# Altium schematic symbol library MYLIB.SchLib: 366 symbols (part 2 of 52)
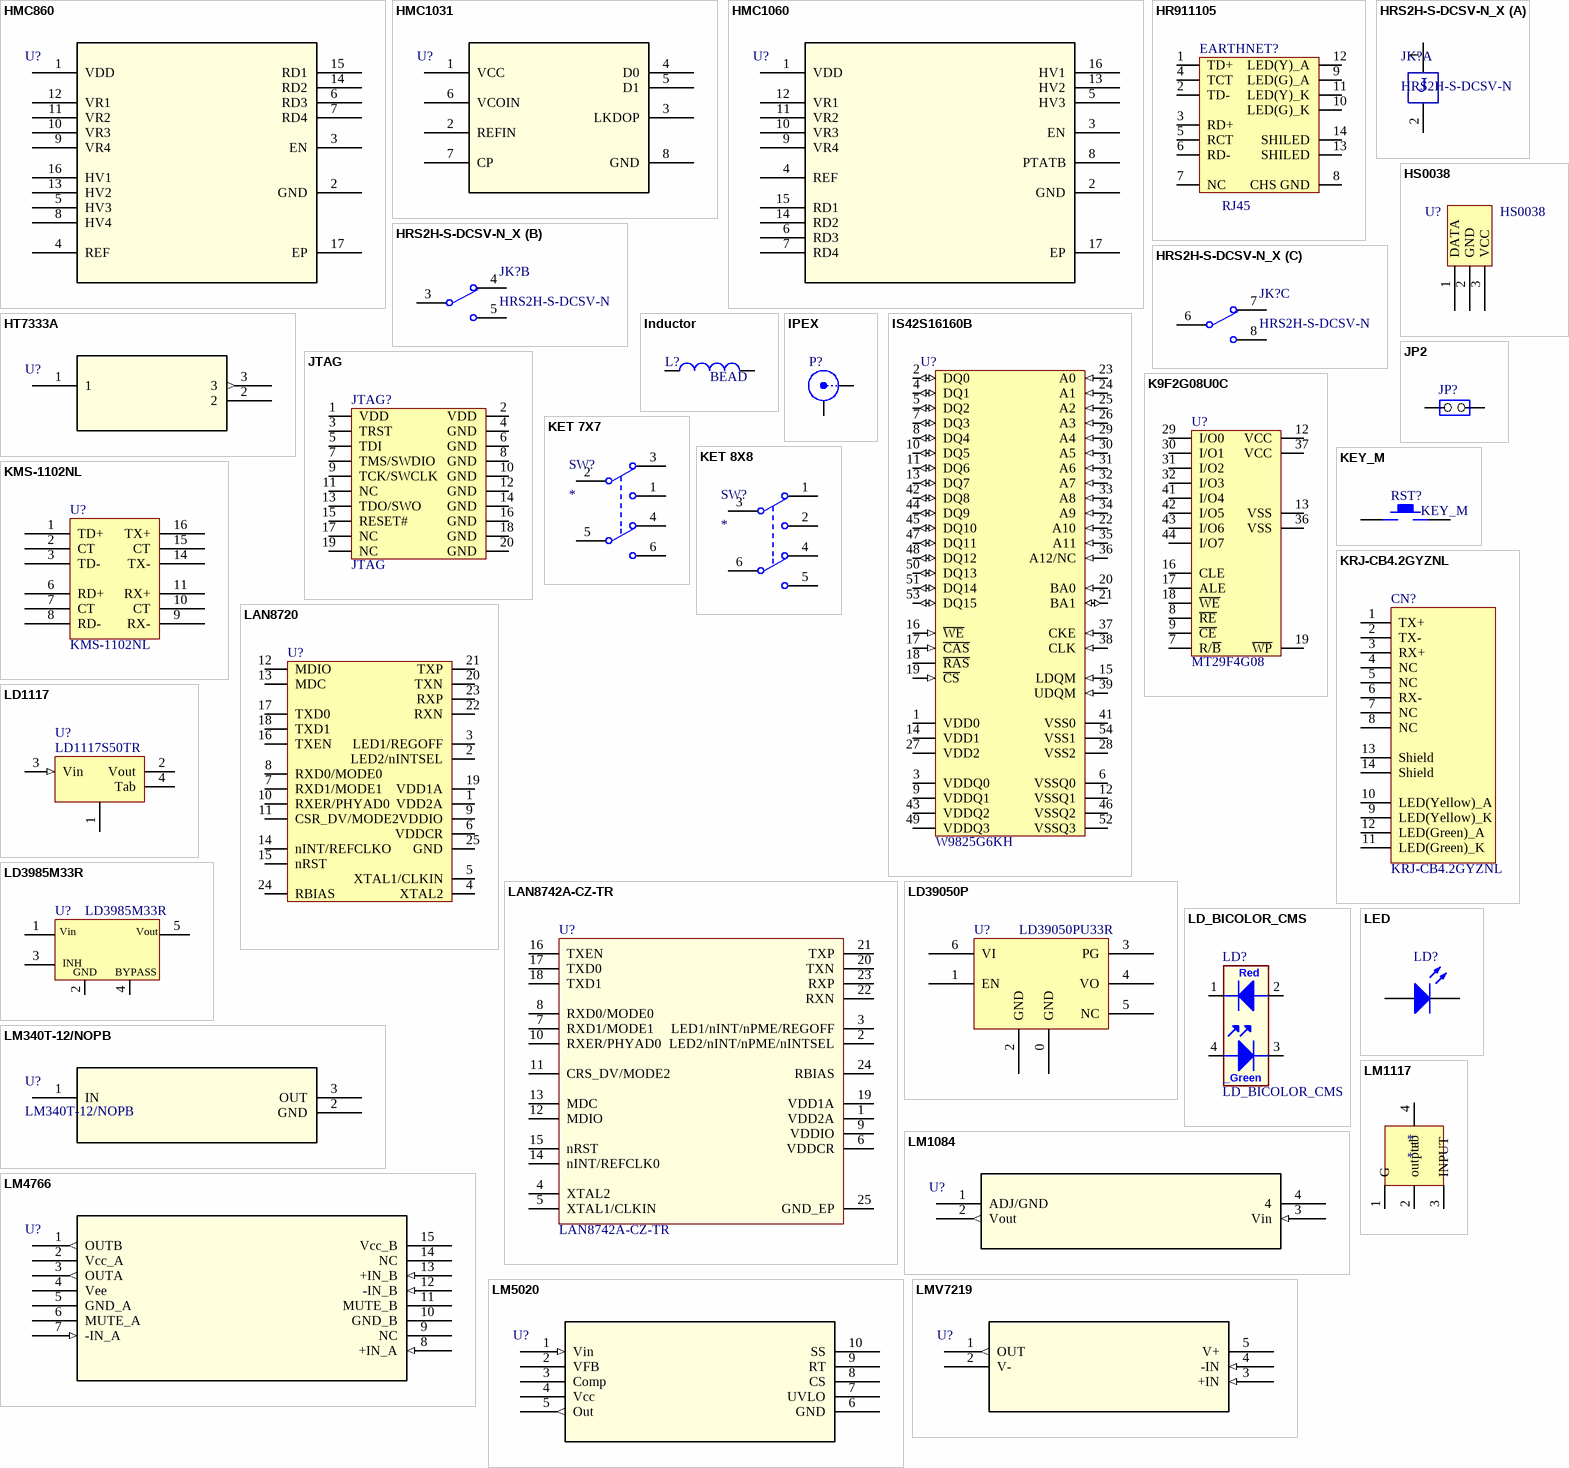
[diagram p308: symbols HMC860 to LMV7219]

## LM1084
designator U?
5A 固定/可调输出线性稳压器; Manufacturer_Part_Number: LM1084ISX-3.3/NOPB; Vendor: Texas Instruments; Built_By: EMA_UL_Team; Copyright: Copyright (C) 2018 Accelerated Designs. All rights reserved; RefDes: RefDes; Type: DEV; Value: Value
footprint TS3B
footprint TS3B-L
footprint TS3B-M
pins: 1 ADJ/GND, 2 Vout (out), 3 Vin (in), 4

## LM1117
designator *
footprint lm 1117 (SOT223, 4-Leads, Body 6.50x7.00mm (avg), Pitch 2.30mm, IPC Medium Density)
pins: 1 G, 2 output, 3 INPUT, 4 tab

## LM4766
designator U?
Manufacturer_Part_Number: LM4766T/NOPB; Vendor: Texas Instruments; Built_By: EMA_UL_Team; Copyright: Copyright (C) 2018 Accelerated Designs. All rights reserved; RefDes: RefDes; Type: DEV; Value: Value
footprint TA15A
pins: 1 OUTB (out), 2 Vcc_A, 3 OUTA (out), 4 Vee, 5 GND_A, 6 MUTE_A, 7 -IN_A (in), 8 +IN_A (in), 9 NC, 10 GND_B, 11 MUTE_B, 12 -IN_B (in), 13 +IN_B (in), 14 NC, 15 Vcc_B

## LM5020
designator U?
13-100V 宽输入电压、电流模式 PWM 升压控制器; Manufacturer_Part_Number: LM5020MM-2/NOPB; Vendor: Texas Instruments; Built_By: EMA_UL_Team; Copyright: Copyright (C) 2018 Accelerated Designs. All rights reserved; RefDes: RefDes; Type: DEV; Value: Value
footprint MUB10A
pins: 1 Vin (in), 2 VFB, 3 Comp, 4 Vcc, 5 Out (out), 6 GND, 7 UVLO, 8 CS, 9 RT, 10 SS

## LMV7219
designator U?
LMV7219 7-ns 2.7-V to 5-V Comparator with Rail-to-Rail Output; Manufacturer_Part_Number: LMV7219M7/NOPB; Vendor: Texas Instruments; Built_By: EMA_UL_Team; Copyright: Copyright (C) 2018 Accelerated Designs. All rights reserved; RefDes: RefDes; Type: DEV; Value: Value
footprint MAA05A
pins: 1 OUT (out), 2 V-, 3 +IN (in), 4 -IN (in), 5 V+

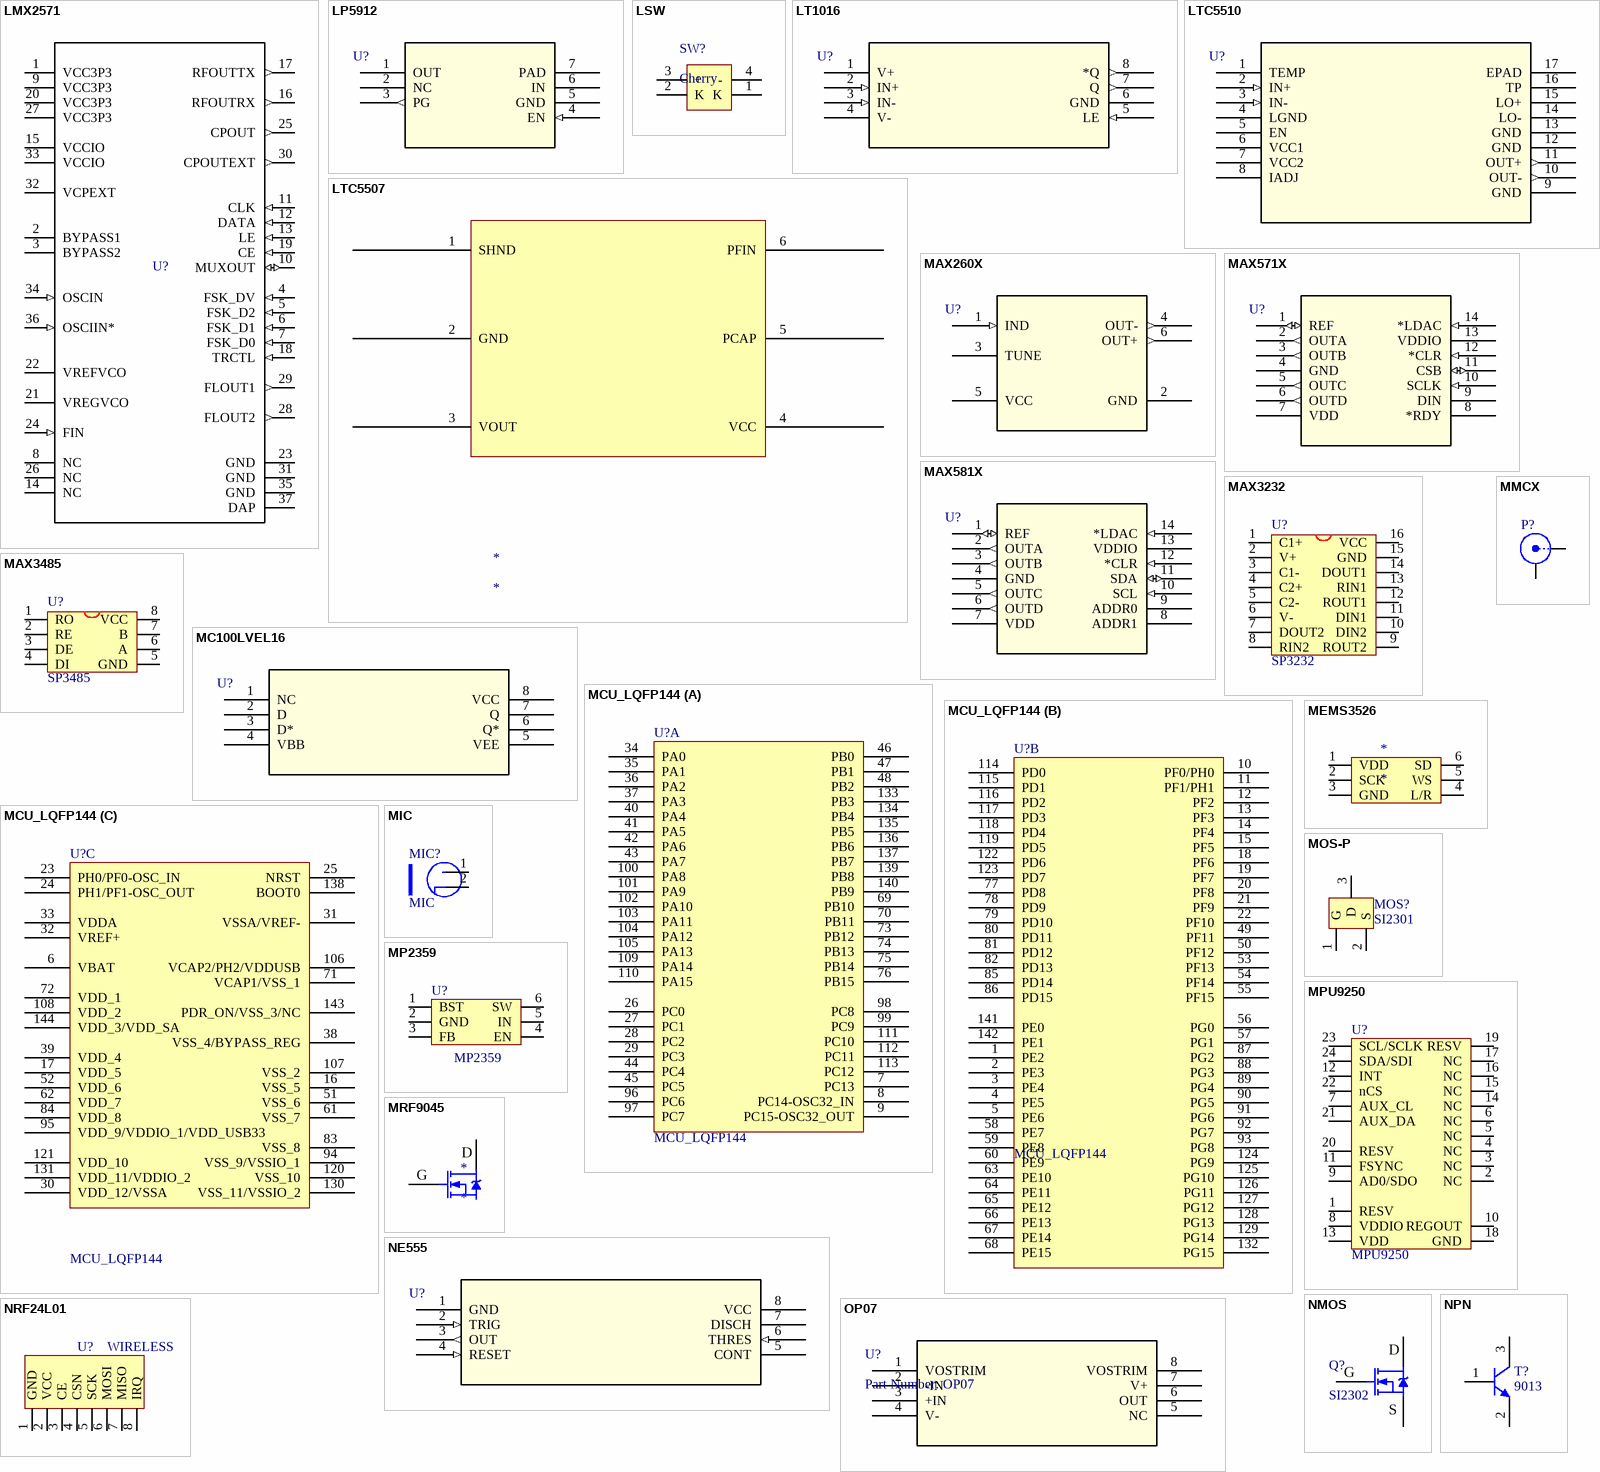
[diagram p8: symbols LMX2571 to OP07]

## LMX2571
designator U?
采用 FSK 调制的低功耗合成器; Manufacturer_Part_Number: LMX2571NJKR; Alternate_PartNumber: LMX2571NJKT; Vendor: Texas Instruments; Built_By: Texas_Instrument_Team; CompType: IC; Copyright: Copyright (C) 2018 Accelerated Designs. All rights reserved; RefDes: RefDes; Type: DEV; Value: Value; PartNumber: LMX2571NJKR; PackageReference: NJK0036A; MountType: SMT; RoHS: Y; Manufacturer: Texas Instruments
footprint NJK0036A
pins: 1 VCC3P3 (power), 2 BYPASS1, 3 BYPASS2 (power), 4 FSK_DV (in), 5 FSK_D2 (in), 6 FSK_D1 (in), 7 FSK_D0 (in), 8 NC (power), 9 VCC3P3 (power), 10 MUXOUT (io), 11 CLK (in), 12 DATA (in), 13 LE (in), 14 NC, 15 VCCIO (power), 16 RFOUTRX (out), 17 RFOUTTX (out), 18 TRCTL (in), 19 CE (in), 20 VCC3P3 (power), 21 VREGVCO (power), 22 VREFVCO (power), 23 GND (power), 24 FIN (in), 25 CPOUT (out), 26 NC, 27 VCC3P3 (power), 28 FLOUT2 (out), 29 FLOUT1 (out), 30 CPOUTEXT (out), 31 GND (power), 32 VCPEXT (power), 33 VCCIO (power), 34 OSCIN (in), 35 GND (power), 36 OSCIIN* (in), 37 DAP (power)

## LP5912
designator U?
LP5912 用于 RF 和模拟电路的超低噪音、500mA 线性稳压器; Manufacturer_Part_Number: LP5912-1.2DRVT; Vendor: Texas Instruments; Built_By: EMA_UL_Team; Copyright: Copyright (C) 2018 Accelerated Designs. All rights reserved; RefDes: RefDes; Type: DEV; Value: Value
footprint DRV0006A
pins: 1 OUT (power), 2 NC, 3 PG (out), 4 EN (in), 5 GND (power), 6 IN (power), 7 PAD (power)

## LSW
designator SW?, comment Cherry
带灯机械按键开关; 版权归属: 源创客; BOM名称: 带灯机械按键开关; 学习资源: www.ooocke.com
footprint LSW DIP-CHERRY
pins: 1 K, 2 K, 3 +, 4 -

## LT1016
designator U?
超快精准 10ns 比较器; Manufacturer_Part_Number: LT1016CS8#PBF; Vendor: Linear Technology; Built_By: EMA_UL_Team; Copyright: Copyright (C) 2018 Accelerated Designs. All rights reserved; RefDes: RefDes; Type: DEV; Value: Value
footprint SO-8_S
pins: 1 V+ (power), 2 IN+ (in), 3 IN- (in), 4 V- (power), 5 LE (in), 6 GND (power), 7 Q (out), 8 *Q (out)

## LTC5507
designator *
pins: 1 SHND, 2 GND, 3 VOUT, 4 VCC, 5 PCAP, 6 PFIN

## LTC5510
designator U?
1MHz 至 6GHz、宽带、高线性度有源混频器; Manufacturer_Part_Number: LTC5510IUF#TRPBF; Vendor: Linear Technology; Built_By: EMA_UL_Team; Copyright: Copyright (C) 2018 Accelerated Designs. All rights reserved; RefDes: RefDes; Type: DEV; Value: Value
footprint QFN-16_UF
footprint QFN-16_UF-L
footprint QFN-16_UF-M
pins: 1 TEMP, 2 IN+ (in), 3 IN- (in), 4 LGND (power), 5 EN, 6 VCC1 (power), 7 VCC2 (power), 8 IADJ, 9 GND (power), 10 OUT- (out), 11 OUT+ (out), 12 GND (power), 13 GND (power), 14 LO-, 15 LO+, 16 TP, 17 EPAD

## MAX260X
designator U?
45MHz至650MHz、集成中频VCO，差分输出; Manufacturer_Part_Number: MAX2606EUT+T; Built_By: EMA_UL_Team; Vendor: Maxim Integrated Products; Copyright: Copyright (C) 2018 Accelerated Designs. All rights reserved; RefDes: RefDes; Type: DEV; Value: Value
footprint 21-0058I
pins: 1 IND (in), 2 GND (power), 3 TUNE, 4 OUT- (out), 5 VCC (power), 6 OUT+ (out)

## MAX571X
designator U?
四通道、超小尺寸8/10/12位缓冲输出DAC，内置基准和SPI接口; Manufacturer_Part_Number: MAX5815BAUD+T; Vendor: Maxim Integrated Products; Built_By: Digital_Papaya_Team; Copyright: Copyright (C) 2016 Accelerated Designs. All rights reserved; RefDes: RefDes; Type: DEV; Value: Value
footprint 21-0066-N_90-011
pins: 1 REF (io), 2 OUTA (out), 3 OUTB (out), 4 GND, 5 OUTC (out), 6 OUTD (out), 7 VDD (power), 8 *RDY, 9 DIN, 10 SCLK (in), 11 CSB (io), 12 *CLR (in), 13 VDDIO (power), 14 *LDAC (in)

## MAX581X
designator U?
四通道、超小尺寸8/10/12位缓冲输出DAC，内置基准和I²C接口; Manufacturer_Part_Number: MAX5815BAUD+T; Vendor: Maxim Integrated Products; Built_By: Digital_Papaya_Team; Copyright: Copyright (C) 2016 Accelerated Designs. All rights reserved; RefDes: RefDes; Type: DEV; Value: Value
footprint 21-0066-N_90-011
pins: 1 REF (io), 2 OUTA (out), 3 OUTB (out), 4 GND, 5 OUTC (out), 6 OUTD (out), 7 VDD (power), 8 ADDR1, 9 ADDR0, 10 SCL (in), 11 SDA (io), 12 *CLR (in), 13 VDDIO (power), 14 *LDAC (in)

## MAX3232
designator U?, comment SP3232
footprint SOP16M
pins: 1 C1+, 2 V+, 3 C1-, 4 C2+, 5 C2-, 6 V-, 7 DOUT2, 8 RIN2, 9 ROUT2, 10 DIN2, 11 DIN1, 12 ROUT1, 13 RIN1, 14 DOUT1, 15 GND, 16 VCC

## MAX3485
designator U?, comment SP3485
footprint SOP-8 (SOP)
pins: 1 RO, 2 RE, 3 DE, 4 DI, 5 GND, 6 A, 7 B, 8 VCC

## MC100LVEL16
designator U?
3.3VECL Differential Receiver; Manufacturer_Part_Number: AD8671ARZ; Vendor: Analog Devices Inc; Built_By: EMA_UL_Team; Copyright: Copyright (C) 2018 Accelerated Designs. All rights reserved; RefDes: RefDes; Type: DEV; Value: Value
footprint R_8
footprint R_8-L
footprint R_8-M
pins: 1 NC, 2 D, 3 D*, 4 VBB (power), 5 VEE, 6 Q*, 7 Q (power), 8 VCC

## MCU_LQFP144
designator U?
footprint TQFP144_M (Footprint not found)
footprint IC149-144-045-B5
footprint LQFP144 (Footprint not found)
footprint LQFP144_0R5_SKT (Footprint not found)
part A pins: 7 PC13, 8 PC14-OSC32_IN, 9 PC15-OSC32_OUT, 26 PC0, 27 PC1, 28 PC2, 29 PC3, 34 PA0, 35 PA1, 36 PA2, 37 PA3, 40 PA4, 41 PA5, 42 PA6, 43 PA7, 44 PC4, 45 PC5, 46 PB0, 47 PB1, 48 PB2, 69 PB10, 70 PB11, 73 PB12, 74 PB13, 75 PB14, 76 PB15, 96 PC6, 97 PC7, 98 PC8, 99 PC9, 100 PA8, 101 PA9, 102 PA10, 103 PA11, 104 PA12, 105 PA13, 109 PA14, 110 PA15, 111 PC10, 112 PC11, 113 PC12, 133 PB3, 134 PB4, 135 PB5, 136 PB6, 137 PB7, 139 PB8, 140 PB9
part B pins: 1 PE2, 2 PE3, 3 PE4, 4 PE5, 5 PE6, 10 PF0/PH0, 11 PF1/PH1, 12 PF2, 13 PF3, 14 PF4, 15 PF5, 18 PF6, 19 PF7, 20 PF8, 21 PF9, 22 PF10, 49 PF11, 50 PF12, 53 PF13, 54 PF14, 55 PF15, 56 PG0, 57 PG1, 58 PE7, 59 PE8, 60 PE9, 63 PE10, 64 PE11, 65 PE12, 66 PE13, 67 PE14, 68 PE15, 77 PD8, 78 PD9, 79 PD10, 80 PD11, 81 PD12, 82 PD13, 85 PD14, 86 PD15, 87 PG2, 88 PG3, 89 PG4, 90 PG5, 91 PG6, 92 PG7, 93 PG8, 114 PD0, 115 PD1, 116 PD2, 117 PD3, 118 PD4, 119 PD5, 122 PD6, 123 PD7, 124 PG9, 125 PG10, 126 PG11, 127 PG12, 128 PG13, 129 PG14, 132 PG15, 141 PE0, 142 PE1
part C pins: 6 VBAT, 16 VSS_5, 17 VDD_5, 23 PH0/PF0-OSC_IN, 24 PH1/PF1-OSC_OUT, 25 NRST, 30 VDD_12/VSSA, 31 VSSA/VREF-, 32 VREF+, 33 VDDA, 38 VSS_4/BYPASS_REG, 39 VDD_4, 51 VSS_6, 52 VDD_6, 61 VSS_7, 62 VDD_7, 71 VCAP1/VSS_1, 72 VDD_1, 83 VSS_8, 84 VDD_8, 94 VSS_9/VSSIO_1, 95 VDD_9/VDDIO_1/VDD_USB33, 106 VCAP2/PH2/VDDUSB, 107 VSS_2, 108 VDD_2, 120 VSS_10, 121 VDD_10, 130 VSS_11/VSSIO_2, 131 VDD_11/VDDIO_2, 138 BOOT0, 143 PDR_ON/VSS_3/NC, 144 VDD_3/VDD_SA

## MEMS3526
designator *
footprint MEMS3526
pins: 1 VDD, 2 SCK, 3 GND, 4 L/R, 5 WS, 6 SD

## MIC
designator MIC?
footprint MIC-6022 (6mm*2.2mm)
pins: 1 VCC, 2 GND
1 alternate drawing of the same symbol

## MMCX
designator P?  (value not drawn)
MMCX Connector
footprint MMCX_KE
footprint MMCX_KWE
pins: 1 X, 2 Y

## MOS-P
designator MOS?, comment SI2301
IRLML6401/SI2301
footprint SO-G3/C2.5 (SOT-23; 3 Leads; Body 3.0 x 2.6 mm, inc. leads (LxW max))
pins: 1 G, 2 S, 3 D

## MP2359
designator U?
DC DC Step Down IC
footprint SOT-23-6
pins: 1 BST, 2 GND, 3 FB, 4 EN, 5 IN, 6 SW

## MPU9250
designator U?
9轴运动处理传感器
footprint QFN24-t (QFN, 24-Leads, Body 3.0x3.0mm (max), Pitch 0.40mm,)
pins: 1 RESV, 2 NC, 3 NC, 4 NC, 5 NC, 6 NC, 7 AUX_CL, 8 VDDIO, 9 AD0/SDO, 10 REGOUT, 11 FSYNC, 12 INT, 13 VDD, 14 NC, 15 NC, 16 NC, 17 NC, 18 GND, 19 RESV, 20 RESV, 21 AUX_DA, 22 nCS, 23 SCL/SCLK, 24 SDA/SDI

## MRF9045
designator *
footprint 9045
pins: 1 G, 2 D

## NE555
designator U?
Single Precision Timer; Manufacturer: Texas Instruments; GENERIC_PART_NUMBER: NE555; INDUSTRY_STD_PKG_TYPE: PDIP; FAMILY_NAME: TIMERS(CT); PIN_COUNT: 8; PACKAGE_DESIGNATOR: P; Datasheet_URL: http://www.ti.com/lit/gpn/NE555; Copyright: Copyright (C) 2018 Accelerated Designs. All rights reserved; RefDes: RefDes; Type: DEV; Value: Value
footprint P8
footprint D8
footprint D8-M
footprint D8-L
pins: 1 GND (power), 2 TRIG (in), 3 OUT (out), 4 RESET (in), 5 CONT, 6 THRES (in), 7 DISCH, 8 VCC (power)

## NMOS
designator Q?, comment SI2302
N沟道场效应管; 版权归属: 源创客; BOM名称: N沟道场效应管; 学习资源: www.ooocke.com
footprint SOT-23
pins: 1 G, 2 S, 3 D

## NPN
designator T?, comment 9013
NPN Bipolar Transistor; Code - JEDEC: TO-226-AA; Published: 8-Jun-2000; Revision: July-2002: Re-released for DXP Platform.; Publisher: Altium Limited
footprint BCY-W3 (TO, Flat Index; 3 In-Line, Axial Leads; Body Dia. 4.8mm)
simulation model NPN
signal-integrity model NPN
footprint SOT-23
footprint SOT23-213 (Footprint not found)
pins: 1 B, 2 E, 3 C

## NRF24L01
designator U?, comment WIRELESS
footprint NRF24L01
pins: 1 GND, 2 VCC, 3 CE, 4 CSN, 5 SCK, 6 MOSI, 7 MISO, 8 IRQ

## OP07
designator U?, comment Part Number: OP07
No Description Available; Manufacturer_Part_Number: AD8671ARZ; Vendor: Analog Devices Inc; Built_By: EMA_UL_Team; Copyright: Copyright (C) 2018 Accelerated Designs. All rights reserved; RefDes: RefDes; Type: DEV; Value: Value
footprint R_8
footprint R_8-L
footprint R_8-M
pins: 1 VOSTRIM, 2 -IN, 3 +IN, 4 V- (power), 5 NC, 6 OUT, 7 V+ (power), 8 VOSTRIM

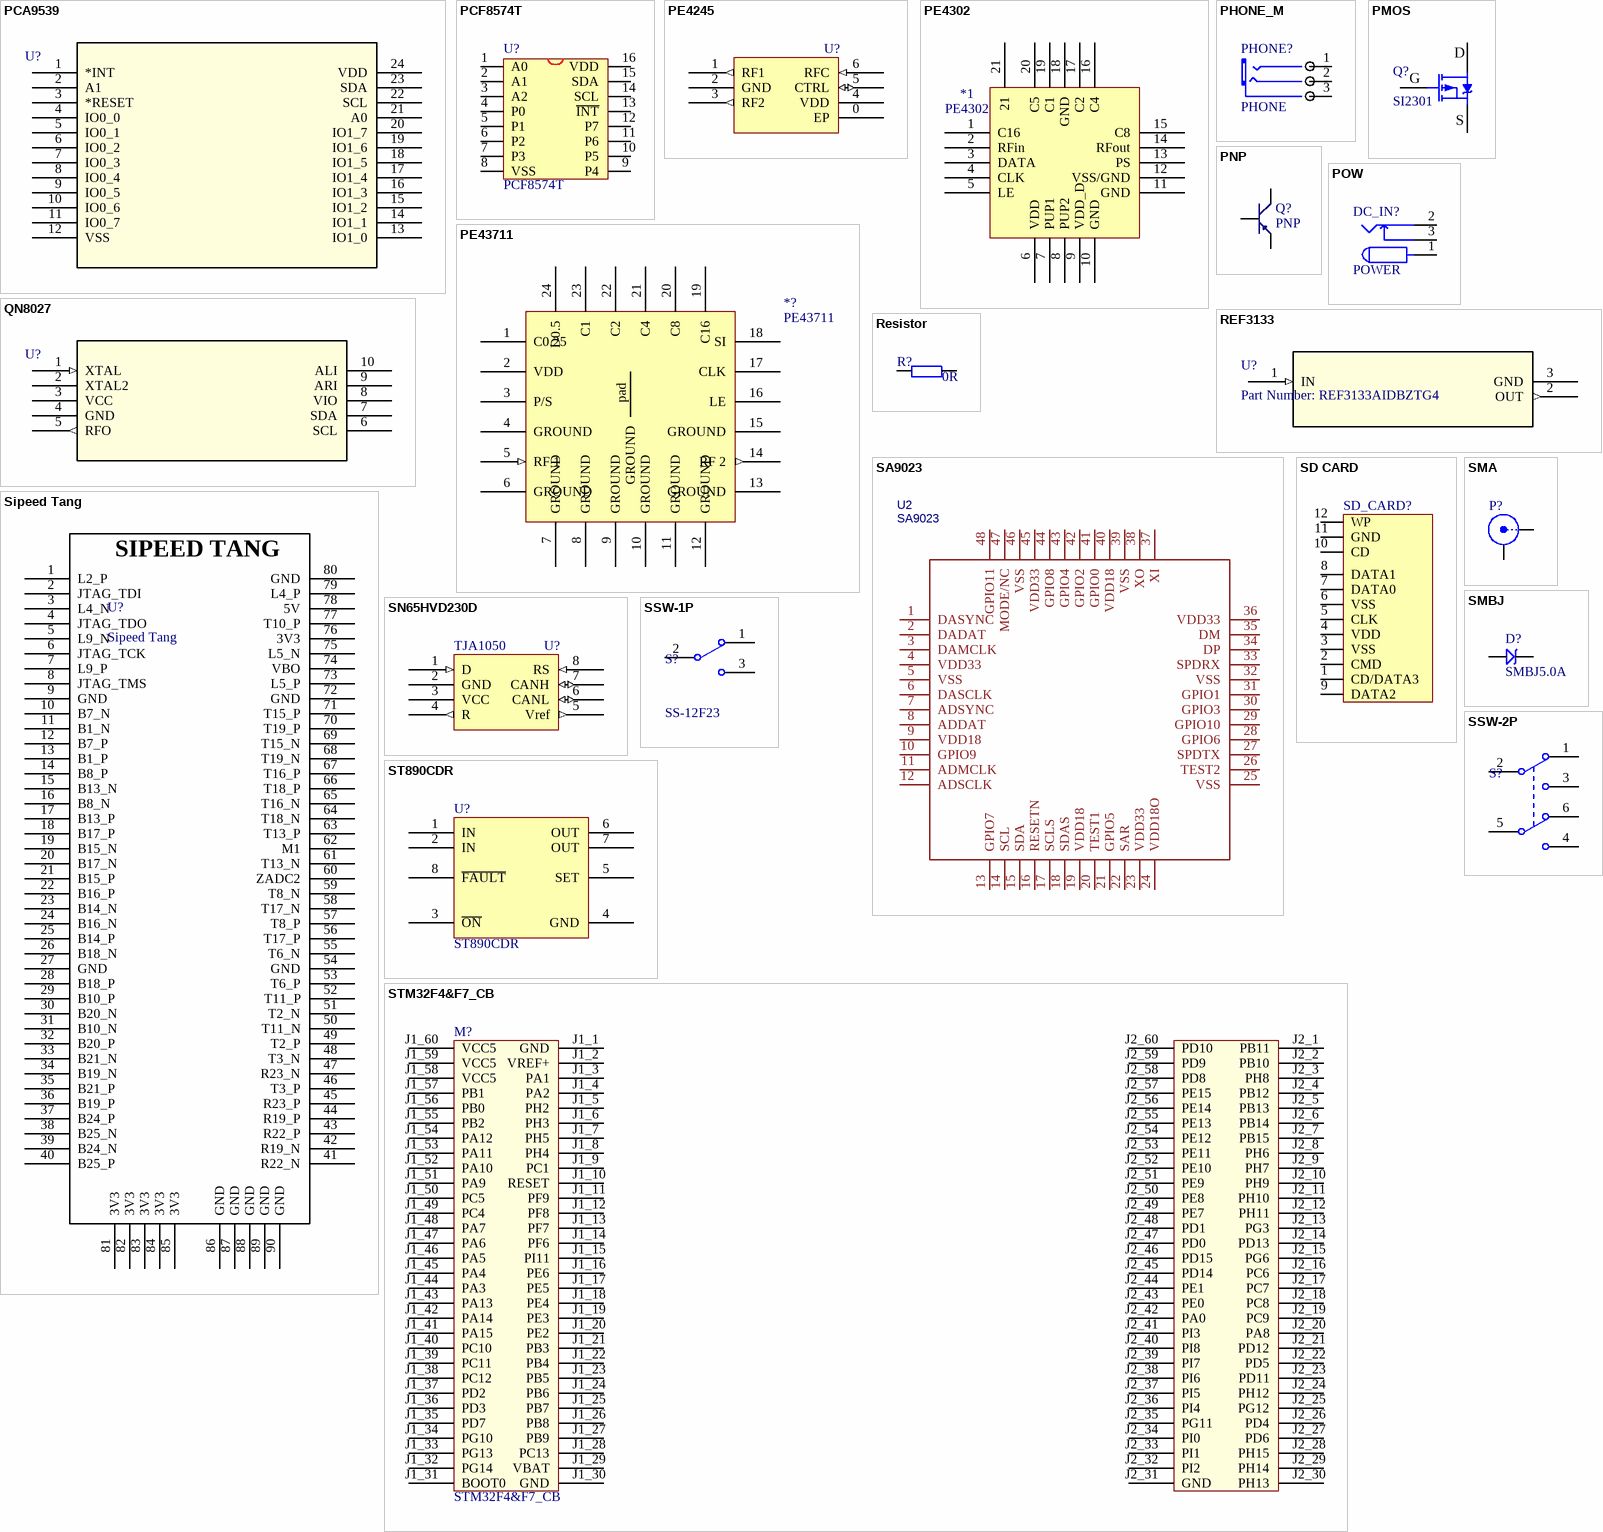
[diagram p9: symbols PCA9539 to STM32F4&F7_CB]

## PCA9539
designator U?
Manufacturer_Part_Number: PCA9539PW; Vendor: NXP; Built_By: EMA_UL_Team; Copyright: Copyright (C) 2018 Accelerated Designs. All rights reserved; RefDes: RefDes; Type: DEV; Value: Value
footprint SOT355-1
pins: 1 *INT, 2 A1, 3 *RESET, 4 IO0_0, 5 IO0_1, 6 IO0_2, 7 IO0_3, 8 IO0_4, 9 IO0_5, 10 IO0_6, 11 IO0_7, 12 VSS, 13 IO1_0, 14 IO1_1, 15 IO1_2, 16 IO1_3, 17 IO1_4, 18 IO1_5, 19 IO1_6, 20 IO1_7, 21 A0, 22 SCL, 23 SDA, 24 VDD

## PCF8574T
designator U?
8路IO扩展,IIC接口
footprint SO-16 (16 leads,body width 7.5mm,pitch 1.27mm)
pins: 1 A0, 2 A1, 3 A2, 4 P0, 5 P1, 6 P2, 7 P3, 8 VSS, 9 P4, 10 P5, 11 P6, 12 P7, 13 ~{INT}, 14 SCL, 15 SDA, 16 VDD

## PE4245
designator U?
footprint DFN6_0R95_3x3_TP (500 mA low quiescent current and low noise voltage regulator)
pins: 0 EP (power), 1 RF1 (out), 2 GND (power), 3 RF2 (out), 4 VDD (power), 5 CTRL (io), 6 RFC (in)
2 alternate drawings of the same symbol

## PE4302
designator *1
footprint QFN20_L (QFN, 20-Leads, Body 4x4mm, Pitch 0.5mm, Thermal Pad 2.3x2.3mm, IPC High Density)
pins: 1 C16, 2 RFin, 3 DATA, 4 CLK, 5 LE, 6 VDD, 7 PUP1, 8 PUP2, 9 VDD_D, 10 GND, 11 GND, 12 VSS/GND, 13 PS, 14 RFout, 15 C8, 16 C4, 17 C2, 18 GND, 19 C1, 20 C5, 21

## PE43711
designator *?
footprint PE43711 (5V)
pins: 1 C0.25 (oc), 2 VDD (power), 3 P/S, 4 GROUND, 5 RF 1 (in), 6 GROUND, 7 GROUND, 8 GROUND, 9 GROUND, 10 GROUND, 11 GROUND, 12 GROUND, 13 GROUND, 14 RF 2 (out), 15 GROUND, 16 LE, 17 CLK, 18 SI, 19 C16 (oc), 20 C8, 21 C4, 22 C2, 23 C1, 24 D0.5, pad GROUND

## PHONE_M
designator PHONE?, comment PHONE
footprint PHONE_ST
pins: 1 CHL, 2 CHR, 3 COM

## PMOS
designator Q?, comment SI2301
P沟道场效应管; 版权归属: 源创客; BOM名称: P沟道场效应管; 学习资源: www.ooocke.com
footprint SOT-23
pins: 1 G, 2 S, 3 D

## PNP
designator Q?
8550/BCW68
footprint SOT-23R (SOT-23; 3 Leads; Body 3.0 x 2.5 mm, inc. leads (LxW max))
pins: 1 E, 2 B, 3 C

## POW
designator DC_IN?, comment POWER
footprint DC10B
pins: 1, 2, 3

## QN8027
designator U?
FM发射; Manufacturer_Part_Number: LM5020MM-2/NOPB; Vendor: Texas Instruments; Built_By: EMA_UL_Team; Copyright: Copyright (C) 2018 Accelerated Designs. All rights reserved; RefDes: RefDes; Type: DEV; Value: Value
footprint MUB10A
pins: 1 XTAL (in), 2 XTAL2, 3 VCC, 4 GND, 5 RFO (out), 6 SCL, 7 SDA, 8 VIO, 9 ARI, 10 ALI

## REF3133
designator U?, comment Part Number: REF3133AIDBZTG4
采用 SOT23-3 封装最大漂移 20ppm/℃ 静态电流 100µA 的3.3v电压基准; Vendor: Texas Instruments; Built_By: EMA_UL_Team; Manufacturer_Part_Number: REF3133AIDBZTG4; Copyright: Copyright (C) 2018 Accelerated Designs. All rights reserved; RefDes: RefDes; Type: DEV; Value: Value
footprint DBZ3
footprint DBZ3-L
footprint DBZ3-M
pins: 1 IN (in), 2 OUT (out), 3 GND (power)

## Resistor
designator R?, comment 0R
Resistor
footprint 0805
footprint 1206
footprint 0402
footprint 0603R (Chip Resistor, Body 1.6x0.8mm, IPC Medium Density)
pins: 1, 2

## SA9023
designator U2
Contributor: sunzhaod; spicePre: U; spiceSymbolName: SA9023
footprint TQFP48
pins: 1 DASYNC, 2 DADAT, 3 DAMCLK, 4 VDD33, 5 VSS, 6 DASCLK, 7 ADSYNC, 8 ADDAT, 9 VDD18, 10 GPIO9, 11 ADMCLK, 12 ADSCLK, 13 GPIO7, 14 SCL, 15 SDA, 16 RESETN, 17 SCLS, 18 SDAS, 19 VDD18, 20 TEST1, 21 GPIO5, 22 SAR, 23 VDD33, 24 VDD18O, 25 VSS, 26 TEST2, 27 SPDTX, 28 GPIO6, 29 GPIO10, 30 GPIO3, 31 GPIO1, 32 VSS, 33 SPDRX, 34 DP, 35 DM, 36 VDD33, 37 XI, 38 XO, 39 VSS, 40 VDD18, 41 GPIO0, 42 GPIO2, 43 GPIO4, 44 GPIO8, 45 VDD33, 46 VSS, 47 MODE/NC, 48 GPIO11

## SD CARD
designator SD_CARD?
footprint SDCARD_L
pins: 1 CD/DATA3, 2 CMD, 3 VSS, 4 VDD, 5 CLK, 6 VSS, 7 DATA0, 8 DATA1, 9 DATA2, 10 CD, 11 GND, 12 WP

## Sipeed Tang
designator U?
footprint Sipeed Tang
pins: 1 L2_P, 2 JTAG_TDI, 3 L4_N, 4 JTAG_TDO, 5 L9_N, 6 JTAG_TCK, 7 L9_P, 8 JTAG_TMS, 9 GND, 10 B7_N, 11 B1_N, 12 B7_P, 13 B1_P, 14 B8_P, 15 B13_N, 16 B8_N, 17 B13_P, 18 B17_P, 19 B15_N, 20 B17_N, 21 B15_P, 22 B16_P, 23 B14_N, 24 B16_N, 25 B14_P, 26 B18_N, 27 GND, 28 B18_P, 29 B10_P, 30 B20_N, 31 B10_N, 32 B20_P, 33 B21_N, 34 B19_N, 35 B21_P, 36 B19_P, 37 B24_P, 38 B25_N, 39 B24_N, 40 B25_P, 41 R22_N, 42 R19_N, 43 R22_P, 44 R19_P, 45 R23_P, 46 T3_P, 47 R23_N, 48 T3_N, 49 T2_P, 50 T11_N, 51 T2_N, 52 T11_P, 53 T6_P, 54 GND, 55 T6_N, 56 T17_P, 57 T8_P, 58 T17_N, 59 T8_N, 60 ZADC2, 61 T13_N, 62 M1, 63 T13_P, 64 T18_N, 65 T16_N, 66 T18_P, 67 T16_P, 68 T19_N, 69 T15_N, 70 T19_P, 71 T15_P, 72 GND, 73 L5_P, 74 VBO, 75 L5_N, 76 3V3, 77 T10_P, 78 5V, 79 L4_P, 80 GND, 81 3V3, 82 3V3, 83 3V3, 84 3V3, 85 3V3, 86 GND, 87 GND, 88 GND, 89 GND, 90 GND
text: SIPEED TANG

## SMA
designator P?  (value not drawn)
SMA Connector
footprint SMA-V
footprint SMA-SMT
footprint SMA_S
footprint SMA-SINGLESIDE
footprint SMA-V-NARROW
footprint SMA-DOUBLESIDE
footprint SMA-ipex
footprint SMA
pins: 1 X, 2 Y

## SMBJ
designator D?, comment SMBJ5.0A
TVS
footprint SMBJ (3.9*5.6)
pins: 1, 2

## SN65HVD230D
designator U?, comment TJA1050
footprint SOP-8 (SSOP8)
footprint SO8
pins: 1 D (in), 2 GND (power), 3 VCC (power), 4 R (out), 5 Vref (out), 6 CANL (io), 7 CANH (io), 8 RS (in)
2 alternate drawings of the same symbol

## SSW-1P
designator S?, comment SS-12F23
1路波动开关; BOM名称: 波动开关; 版权归属: 源创客; 学习资源: www.ooocke.com
footprint SS-12F23
footprint SS-12D10
footprint MSK-12C01-07 (6.7*2.8*1.5mm(长宽高）)
pins: 1, 2, 3

## SSW-2P
designator S?, comment SK-22D02  (value not drawn)
2路波动开关; BOM名称: 波动开关; 版权归属: 源创客; 学习资源: www.ooocke.com
footprint SK-22D02 (10.4x6.1x4.2mm(长宽高)，脚距：2mm)
footprint SS-22H07-G2 (柄长2mm，12.7x7x4.7mm(长宽高)，脚距：4mm)
footprint SS-22H07-G3 (柄长3mm，12.7x7x4.7mm(长宽高)，脚距：4mm)
footprint SS-22H07-G4 (柄长4mm，12.7x7x4.7mm(长宽高)，脚距：4mm)
footprint SS-22H07-G5 (柄长5mm，12.7x7x4.7mm(长宽高)，脚距：4mm)
footprint SS-22H07-G6 (柄长6mm，12.7x7x4.7mm(长宽高)，脚距：4mm)
footprint SS-22H07-G7 (柄长7mm，12.7x7x4.7mm(长宽高)，脚距：4mm)
footprint SS-22H07-G8 (柄长8mm，12.7x7x4.7mm(长宽高)，脚距：4mm)
footprint SS-22H07-G9 (柄长9mm，12.7x7x4.7mm(长宽高)，脚距：4mm)
pins: 1, 2, 3, 4, 5, 6

## ST890CDR
designator U?
footprint SOIC8_1R27_4R9X6 (Footprint not found)
pins: 1 IN, 2 IN, 3 ~{ON}, 4 GND, 5 SET, 6 OUT, 7 OUT, 8 ~{FAULT}

## STM32F4&F7_CB
designator M?
F429/746 Core Board
footprint STM32F4&F7_CB (PIN:0.5mm;SOP;)
pins: J1_1 GND, J1_2 VREF+, J1_3 PA1, J1_4 PA2, J1_5 PH2, J1_6 PH3, J1_7 PH5, J1_8 PH4, J1_9 PC1, J1_10 RESET, J1_11 PF9, J1_12 PF8, J1_13 PF7, J1_14 PF6, J1_15 PI11, J1_16 PE6, J1_17 PE5, J1_18 PE4, J1_19 PE3, J1_20 PE2, J1_21 PB3, J1_22 PB4, J1_23 PB5, J1_24 PB6, J1_25 PB7, J1_26 PB8, J1_27 PB9, J1_28 PC13, J1_29 VBAT, J1_30 GND, J1_31 BOOT0, J1_32 PG14, J1_33 PG13, J1_34 PG10, J1_35 PD7, J1_36 PD3, J1_37 PD2, J1_38 PC12, J1_39 PC11, J1_40 PC10, J1_41 PA15, J1_42 PA14, J1_43 PA13, J1_44 PA3, J1_45 PA4, J1_46 PA5, J1_47 PA6, J1_48 PA7, J1_49 PC4, J1_50 PC5, J1_51 PA9, J1_52 PA10, J1_53 PA11, J1_54 PA12, J1_55 PB2, J1_56 PB0, J1_57 PB1, J1_58 VCC5, J1_59 VCC5, J1_60 VCC5, J2_1 PB11, J2_2 PB10, J2_3 PH8, J2_4 PB12, J2_5 PB13, J2_6 PB14, J2_7 PB15, J2_8 PH6, J2_9 PH7, J2_10 PH9, J2_11 PH10, J2_12 PH11, J2_13 PG3, J2_14 PD13, J2_15 PG6, J2_16 PC6, J2_17 PC7, J2_18 PC8, J2_19 PC9, J2_20 PA8, J2_21 PD12, J2_22 PD5, J2_23 PD11, J2_24 PH12, J2_25 PG12, J2_26 PD4, J2_27 PD6, J2_28 PH15, J2_29 PH14, J2_30 PH13, J2_31 GND, J2_32 PI2, J2_33 PI1, J2_34 PI0, J2_35 PG11, J2_36 PI4, J2_37 PI5, J2_38 PI6, J2_39 PI7, J2_40 PI8, J2_41 PI3, J2_42 PA0, J2_43 PE0, J2_44 PE1, J2_45 PD14, J2_46 PD15, J2_47 PD0, J2_48 PD1, J2_49 PE7, J2_50 PE8, J2_51 PE9, J2_52 PE10, J2_53 PE11, J2_54 PE12, J2_55 PE13, J2_56 PE14, J2_57 PE15, J2_58 PD8, J2_59 PD9, J2_60 PD10

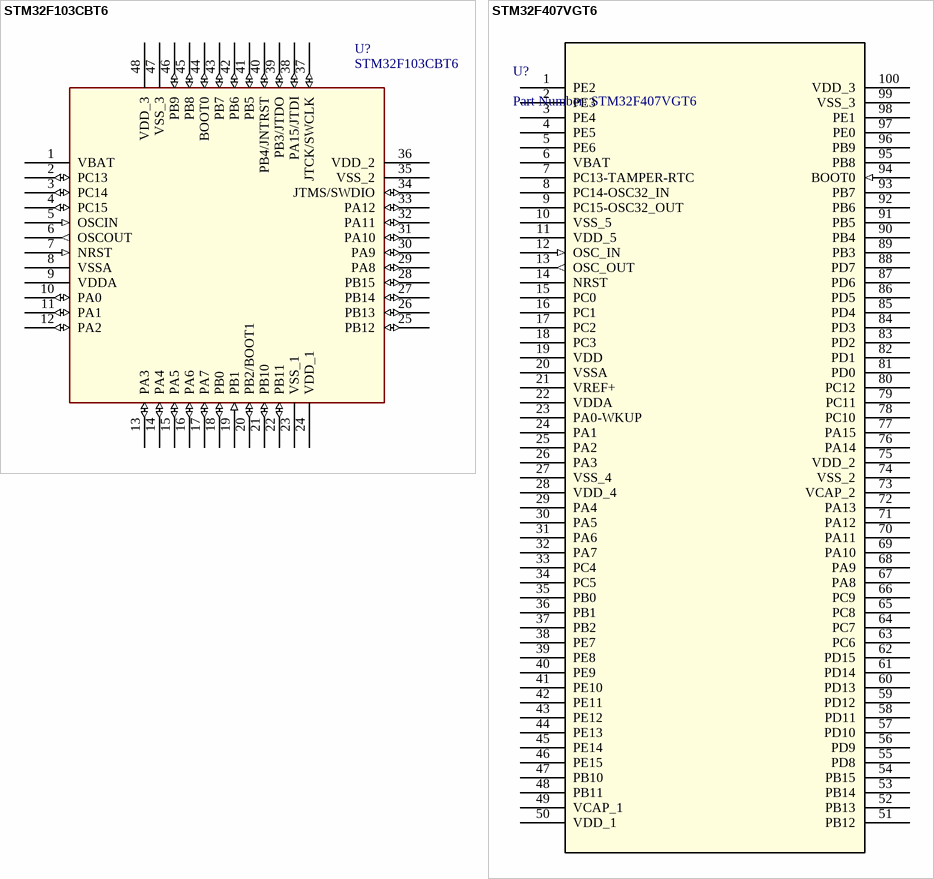
[diagram p10: symbols STM32F103CBT6 to STM32F407VGT6]

## STM32F103CBT6
designator U?
Medium-density performance line ARM-based 32-bit MCU with 64KB Flash; Manuf_Part_1: STM32F103C8T6; Manuf_1: STM; Ref St: 9175981; Provided: ST; ECCN_US/EU: 3A991A2/NEC; Footprint: QFP48 7X7; Distrib: ST; Order: STM32F103C8T6
footprint LQFP48_0R5_7x7 (Footprint not found)
pins: 1 VBAT (power), 2 PC13 (io), 3 PC14 (io), 4 PC15 (io), 5 OSCIN (in), 6 OSCOUT (out), 7 NRST (in), 8 VSSA (power), 9 VDDA (power), 10 PA0 (io), 11 PA1 (io), 12 PA2 (io), 13 PA3 (io), 14 PA4 (io), 15 PA5 (io), 16 PA6 (io), 17 PA7 (io), 18 PB0 (io), 19 PB1 (in), 20 PB2/BOOT1 (io), 21 PB10 (io), 22 PB11 (io), 23 VSS_1 (power), 24 VDD_1 (power), 25 PB12 (io), 26 PB13 (io), 27 PB14 (io), 28 PB15 (io), 29 PA8 (io), 30 PA9 (io), 31 PA10 (io), 32 PA11 (io), 33 PA12 (io), 34 JTMS/SWDIO (io), 35 VSS_2 (power), 36 VDD_2 (power), 37 JTCK/SWCLK (io), 38 PA15/JTDI (io), 39 PB3/JTDO (io), 40 PB4/JNTRST (io), 41 PB5 (io), 42 PB6 (io), 43 PB7 (io), 44 BOOT0 (io), 45 PB8 (io), 46 PB9 (io), 47 VSS_3 (power), 48 VDD_3 (power)

## STM32F407VGT6
designator U?, comment Part Number: STM32F407VGT6
No Description Available; Vendor: STMicroelectronics; Built_By: EMA_UL_Team; Manufacturer_Part_Number: STM32F407VGT6; Copyright: Copyright (C) 2018 Accelerated Designs. All rights reserved; RefDes: RefDes; Type: DEV; Value: Value
footprint LQFP-100
pins: 1 PE2, 2 PE3, 3 PE4, 4 PE5, 5 PE6, 6 VBAT (power), 7 PC13-TAMPER-RTC, 8 PC14-OSC32_IN, 9 PC15-OSC32_OUT, 10 VSS_5 (power), 11 VDD_5 (power), 12 OSC_IN (in), 13 OSC_OUT (out), 14 NRST, 15 PC0, 16 PC1, 17 PC2, 18 PC3, 19 VDD (power), 20 VSSA (power), 21 VREF+ (power), 22 VDDA (power), 23 PA0-WKUP, 24 PA1, 25 PA2, 26 PA3, 27 VSS_4 (power), 28 VDD_4 (power), 29 PA4, 30 PA5, 31 PA6, 32 PA7, 33 PC4, 34 PC5, 35 PB0, 36 PB1, 37 PB2, 38 PE7, 39 PE8, 40 PE9, 41 PE10, 42 PE11, 43 PE12, 44 PE13, 45 PE14, 46 PE15, 47 PB10, 48 PB11, 49 VCAP_1 (power), 50 VDD_1 (power), 51 PB12, 52 PB13, 53 PB14, 54 PB15, 55 PD8, 56 PD9, 57 PD10, 58 PD11, 59 PD12, 60 PD13, 61 PD14, 62 PD15, 63 PC6, 64 PC7, 65 PC8, 66 PC9, 67 PA8, 68 PA9, 69 PA10, 70 PA11, 71 PA12, 72 PA13, 73 VCAP_2, 74 VSS_2 (power), 75 VDD_2 (power), 76 PA14, 77 PA15, 78 PC10, 79 PC11, 80 PC12, 81 PD0, 82 PD1, 83 PD2, 84 PD3, 85 PD4, 86 PD5, 87 PD6, 88 PD7, 89 PB3, 90 PB4, 91 PB5, 92 PB6, 93 PB7, 94 BOOT0 (in), 95 PB8, 96 PB9, 97 PE0, 98 PE1, 99 VSS_3 (power), 100 VDD_3 (power)

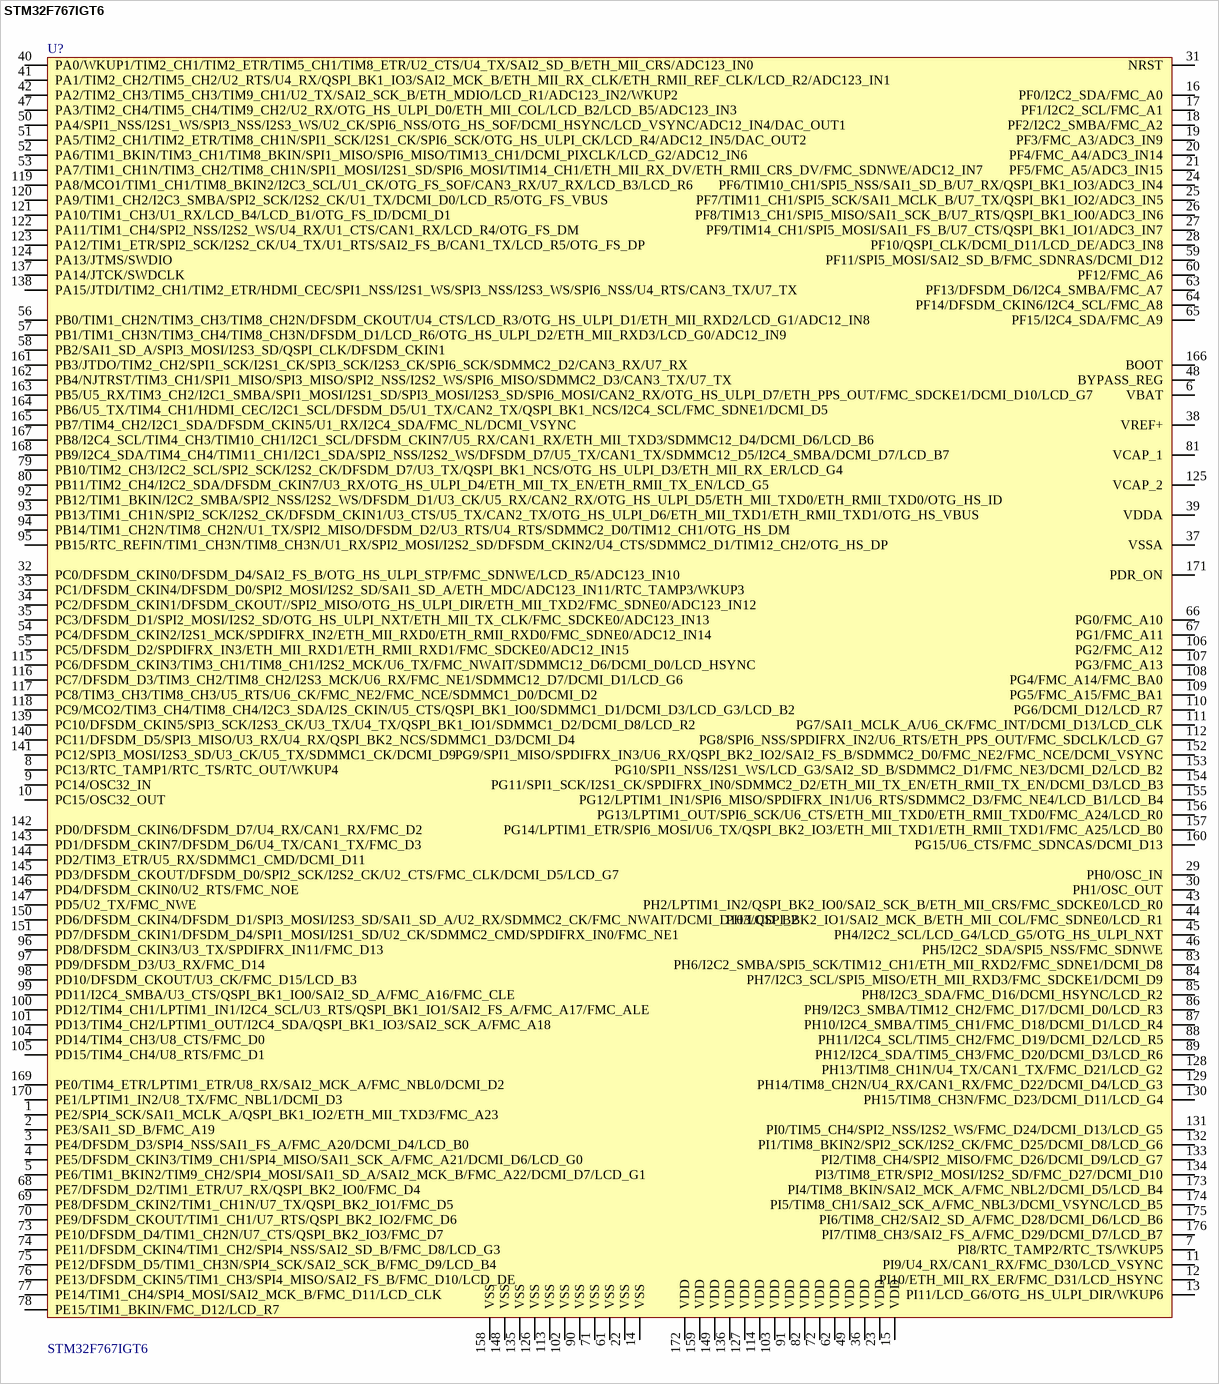
[diagram p11: symbol STM32F767IGT6]
